# Altium schematic symbol library jlcpcb_2025_04_inductors_extended_0805.schlib: 882 symbols (part 4 of 5)
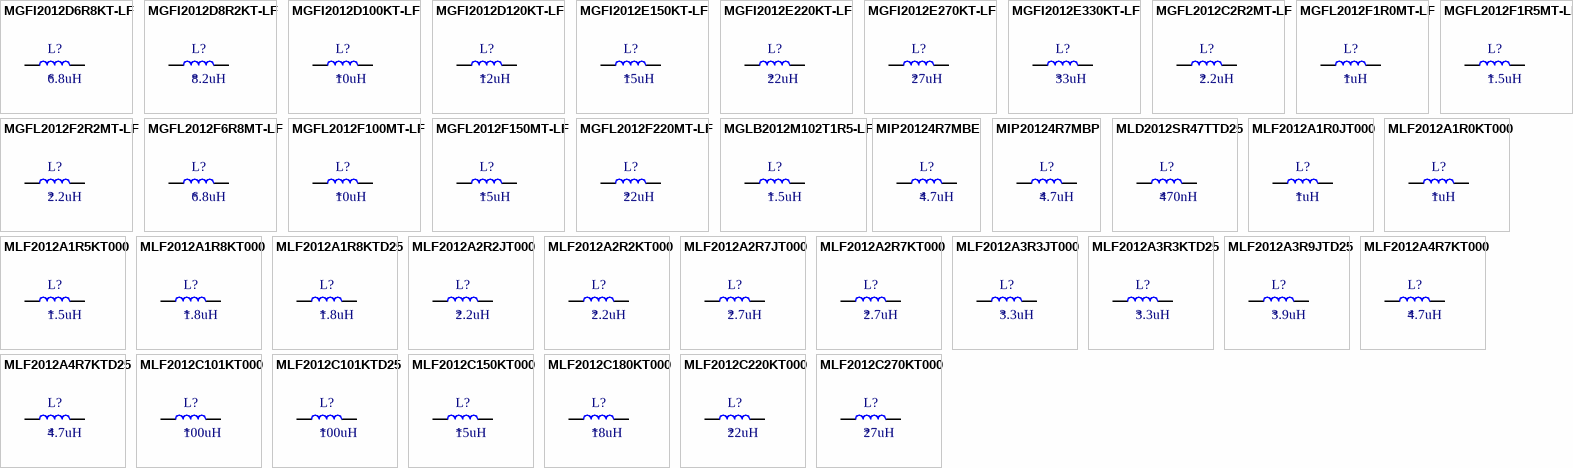
[diagram p25: symbols MGFI2012D6R8KT-LF to MLF2012C270KT000]

## MGLB2012M102T1R5-LF
designator L?  Inductance: 1.5uH
Inductor, 1.5uH, SMD 0805; Manufacturer: microgate; Manufacturer Part Number: MGLB2012M102T1R5-LF; Package Size: 0805; JLCPCB Basic Part: No; JLCPCB Part Number: C5120113; Supplier 1: LCSC; Category: Inductors; Supplier Part Number 1: C5120113; RoHS: Yes; ComponentLink1Description: Datasheet; ComponentLink1URL: https://wmsc.lcsc.com/wmsc/upload/file/pdf/v2/lcsc/2207261100_microgate-MGLB2012M102T1R5-LF_C5120113.pdf; ComponentLink2Description: JLCPCB Part URL; ComponentLink2URL: https://jlcpcb.com/partdetail/C5120113; ComponentLink3Description: LCSC Part URL; ComponentLink3URL: https://lcsc.com/product-detail/Inductors-SMD_microgate-microgate-MGLB2012M102T1R5-LF_C5120113.html
footprint IND-0805 (0805 (2012M) Inductor)
pins: 1, 2

## MIP20124R7MBE
designator L?  Inductance: 4.7uH
Inductor, 4.7uH, ±20%, 230mΩ, 700mA, SMD 0805; Manufacturer: INPAQ; Manufacturer Part Number: MIP20124R7MBE; Package Size: 0805; JLCPCB Basic Part: No; JLCPCB Part Number: C315723; Supplier 1: LCSC; Category: Inductors; Supplier Part Number 1: C315723; Tolerance: ±20%; Rated Current: 700mA; DC Resistance: 230mΩ; RoHS: Yes; ComponentLink1Description: Datasheet; ComponentLink1URL: https://wmsc.lcsc.com/wmsc/upload/file/pdf/v2/lcsc/2304140030_INPAQ-MIP20124R7MBE_C315723.pdf; ComponentLink2Description: JLCPCB Part URL; ComponentLink2URL: https://jlcpcb.com/partdetail/C315723; ComponentLink3Description: LCSC Part URL; ComponentLink3URL: https://lcsc.com/product-detail/Inductors-SMD_INPAQ-INPAQ-MIP20124R7MBE_C315723.html
footprint IND-0805 (0805 (2012M) Inductor)
pins: 1, 2

## MIP20124R7MBP
designator L?  Inductance: 4.7uH
Inductor, 4.7uH, ±20%, SMD 0805; Manufacturer: INPAQ; Manufacturer Part Number: MIP20124R7MBP; Package Size: 0805; JLCPCB Basic Part: No; JLCPCB Part Number: C379996; Supplier 1: LCSC; Category: Inductors; Supplier Part Number 1: C379996; Tolerance: ±20%; RoHS: Yes; ComponentLink1Description: Datasheet; ComponentLink1URL: https://wmsc.lcsc.com/wmsc/upload/file/pdf/v2/lcsc/1912111437_INPAQ-MIP20124R7MBP_C379996.pdf; ComponentLink2Description: JLCPCB Part URL; ComponentLink2URL: https://jlcpcb.com/partdetail/C379996; ComponentLink3Description: LCSC Part URL; ComponentLink3URL: https://lcsc.com/product-detail/Inductors-SMD_INPAQ-INPAQ-MIP20124R7MBP_C379996.html
footprint IND-0805 (0805 (2012M) Inductor)
pins: 1, 2

## MLD2012SR47TTD25
designator L?  Inductance: 470nH
Inductor, 470nH, ±20%, 120mΩ, 1.2A, SMD 0805; Manufacturer: TDK; Manufacturer Part Number: MLD2012SR47TTD25; Package Size: 0805; JLCPCB Basic Part: No; JLCPCB Part Number: C404403; Supplier 1: LCSC; Category: Inductors; Supplier Part Number 1: C404403; Tolerance: ±20%; Rated Current: 1.2A; DC Resistance: 120mΩ; RoHS: Yes; ComponentLink1Description: Datasheet; ComponentLink1URL: https://wmsc.lcsc.com/wmsc/upload/file/pdf/v2/lcsc/2304140030_TDK-MLD2012SR47TTD25_C404403.pdf; ComponentLink2Description: JLCPCB Part URL; ComponentLink2URL: https://jlcpcb.com/partdetail/C404403; ComponentLink3Description: LCSC Part URL; ComponentLink3URL: https://lcsc.com/product-detail/Inductors-SMD_TDK-TDK-MLD2012SR47TTD25_C404403.html
footprint IND-0805 (0805 (2012M) Inductor)
pins: 1, 2

## MLF2012A1R0JT000
designator L?  Inductance: 1uH
Inductor, 1uH, ±5%, 150mΩ, 80mA, SMD 0805; Manufacturer: TDK; Manufacturer Part Number: MLF2012A1R0JT000; Self-Resonant Frequency: 120MHz; Q Factor: 45@10MHz; Package Size: 0805; JLCPCB Basic Part: No; JLCPCB Part Number: C165812; Supplier 1: LCSC; Category: Inductors; Supplier Part Number 1: C165812; Tolerance: ±5%; Rated Current: 80mA; DC Resistance: 150mΩ; RoHS: Yes; ComponentLink1Description: Datasheet; ComponentLink1URL: https://wmsc.lcsc.com/wmsc/upload/file/pdf/v2/lcsc/1810292121_TDK-MLF2012A1R0JT000_C165812.pdf; ComponentLink2Description: JLCPCB Part URL; ComponentLink2URL: https://jlcpcb.com/partdetail/C165812; ComponentLink3Description: LCSC Part URL; ComponentLink3URL: https://lcsc.com/product-detail/Inductors-SMD_TDK-TDK-MLF2012A1R0JT000_C165812.html
footprint IND-0805 (0805 (2012M) Inductor)
pins: 1, 2

## MLF2012A1R0KT000
designator L?  Inductance: 1uH
Inductor, 1uH, ±10%, 150mΩ, 80mA, SMD 0805; Manufacturer: TDK; Manufacturer Part Number: MLF2012A1R0KT000; Self-Resonant Frequency: 120MHz; Q Factor: 45@10MHz; Package Size: 0805; JLCPCB Basic Part: No; JLCPCB Part Number: C19533; Supplier 1: LCSC; Category: Inductors; Supplier Part Number 1: C19533; Tolerance: ±10%; Rated Current: 80mA; DC Resistance: 150mΩ; RoHS: Yes; ComponentLink1Description: Datasheet; ComponentLink1URL: https://wmsc.lcsc.com/wmsc/upload/file/pdf/v2/lcsc/2304140030_TDK-MLF2012A1R0KT000_C19533.pdf; ComponentLink2Description: JLCPCB Part URL; ComponentLink2URL: https://jlcpcb.com/partdetail/C19533; ComponentLink3Description: LCSC Part URL; ComponentLink3URL: https://lcsc.com/product-detail/Inductors-SMD_TDK-TDK-MLF2012A1R0KT000_C19533.html
footprint IND-0805 (0805 (2012M) Inductor)
pins: 1, 2

## MLF2012A1R5KT000
designator L?  Inductance: 1.5uH
Inductor, 1.5uH, ±10%, 180mΩ, 80mA, SMD 0805; Manufacturer: TDK; Manufacturer Part Number: MLF2012A1R5KT000; Self-Resonant Frequency: 140MHz; Q Factor: 60@10MHz; Package Size: 0805; JLCPCB Basic Part: No; JLCPCB Part Number: C275368; Supplier 1: LCSC; Category: Inductors; Supplier Part Number 1: C275368; Tolerance: ±10%; Rated Current: 80mA; DC Resistance: 180mΩ; RoHS: Yes; ComponentLink1Description: Datasheet; ComponentLink1URL: https://wmsc.lcsc.com/wmsc/upload/file/pdf/v2/lcsc/2304140030_TDK-MLF2012A1R5KT000_C275368.pdf; ComponentLink2Description: JLCPCB Part URL; ComponentLink2URL: https://jlcpcb.com/partdetail/C275368; ComponentLink3Description: LCSC Part URL; ComponentLink3URL: https://lcsc.com/product-detail/Inductors-SMD_TDK-TDK-MLF2012A1R5KT000_C275368.html
footprint IND-0805 (0805 (2012M) Inductor)
pins: 1, 2

## MLF2012A1R8KT000
designator L?  Inductance: 1.8uH
Inductor, 1.8uH, ±10%, 200mΩ, 80mA, SMD 0805; Manufacturer: TDK; Manufacturer Part Number: MLF2012A1R8KT000; Self-Resonant Frequency: 90MHz; Q Factor: 45@10MHz; Package Size: 0805; JLCPCB Basic Part: No; JLCPCB Part Number: C15022; Supplier 1: LCSC; Category: Inductors; Supplier Part Number 1: C15022; Tolerance: ±10%; Rated Current: 80mA; DC Resistance: 200mΩ; RoHS: Yes; ComponentLink1Description: Datasheet; ComponentLink1URL: https://wmsc.lcsc.com/wmsc/upload/file/pdf/v2/lcsc/2304140030_TDK-MLF2012A1R8KT000_C15022.pdf; ComponentLink2Description: JLCPCB Part URL; ComponentLink2URL: https://jlcpcb.com/partdetail/C15022; ComponentLink3Description: LCSC Part URL; ComponentLink3URL: https://lcsc.com/product-detail/Inductors-SMD_TDK-TDK-MLF2012A1R8KT000_C15022.html
footprint IND-0805 (0805 (2012M) Inductor)
pins: 1, 2

## MLF2012A1R8KTD25
designator L?  Inductance: 1.8uH
Inductor, 1.8uH, ±10%, 200mΩ, 80mA, SMD 0805; Manufacturer: TDK; Manufacturer Part Number: MLF2012A1R8KTD25; Self-Resonant Frequency: 130MHz; Q Factor: 60@10MHz; Package Size: 0805; JLCPCB Basic Part: No; JLCPCB Part Number: C404466; Supplier 1: LCSC; Category: Inductors; Supplier Part Number 1: C404466; Tolerance: ±10%; Rated Current: 80mA; DC Resistance: 200mΩ; RoHS: Yes; ComponentLink1Description: Datasheet; ComponentLink1URL: https://wmsc.lcsc.com/wmsc/upload/file/pdf/v2/lcsc/2304140030_TDK-MLF2012A1R8KTD25_C404466.pdf; ComponentLink2Description: JLCPCB Part URL; ComponentLink2URL: https://jlcpcb.com/partdetail/C404466; ComponentLink3Description: LCSC Part URL; ComponentLink3URL: https://lcsc.com/product-detail/Inductors-SMD_TDK-TDK-MLF2012A1R8KTD25_C404466.html
footprint IND-0805 (0805 (2012M) Inductor)
pins: 1, 2

## MLF2012A2R2JT000
designator L?  Inductance: 2.2uH
Inductor, 2.2uH, ±5%, 220mΩ, 50mA, SMD 0805; Manufacturer: TDK; Manufacturer Part Number: MLF2012A2R2JT000; Self-Resonant Frequency: 80MHz; Q Factor: 45@10MHz; Package Size: 0805; JLCPCB Basic Part: No; JLCPCB Part Number: C136255; Supplier 1: LCSC; Category: Inductors; Supplier Part Number 1: C136255; Tolerance: ±5%; Rated Current: 50mA; DC Resistance: 220mΩ; RoHS: Yes; ComponentLink1Description: Datasheet; ComponentLink1URL: https://wmsc.lcsc.com/wmsc/upload/file/pdf/v2/lcsc/2304140030_TDK-MLF2012A2R2JT000_C136255.pdf; ComponentLink2Description: JLCPCB Part URL; ComponentLink2URL: https://jlcpcb.com/partdetail/C136255; ComponentLink3Description: LCSC Part URL; ComponentLink3URL: https://lcsc.com/product-detail/Inductors-SMD_TDK-TDK-MLF2012A2R2JT000_C136255.html
footprint IND-0805 (0805 (2012M) Inductor)
pins: 1, 2

## MLF2012A2R2KT000
designator L?  Inductance: 2.2uH
Inductor, 2.2uH, ±10%, 220mΩ, 50mA, SMD 0805; Manufacturer: TDK; Manufacturer Part Number: MLF2012A2R2KT000; Self-Resonant Frequency: 120MHz; Q Factor: 60@10MHz; Package Size: 0805; JLCPCB Basic Part: No; JLCPCB Part Number: C136256; Supplier 1: LCSC; Category: Inductors; Supplier Part Number 1: C136256; Tolerance: ±10%; Rated Current: 50mA; DC Resistance: 220mΩ; RoHS: Yes; ComponentLink1Description: Datasheet; ComponentLink1URL: https://wmsc.lcsc.com/wmsc/upload/file/pdf/v2/lcsc/2304140030_TDK-MLF2012A2R2KT000_C136256.pdf; ComponentLink2Description: JLCPCB Part URL; ComponentLink2URL: https://jlcpcb.com/partdetail/C136256; ComponentLink3Description: LCSC Part URL; ComponentLink3URL: https://lcsc.com/product-detail/Inductors-SMD_TDK-TDK-MLF2012A2R2KT000_C136256.html
footprint IND-0805 (0805 (2012M) Inductor)
pins: 1, 2

## MLF2012A2R7JT000
designator L?  Inductance: 2.7uH
Inductor, 2.7uH, ±5%, 250mΩ, 50mA, SMD 0805; Manufacturer: TDK; Manufacturer Part Number: MLF2012A2R7JT000; Self-Resonant Frequency: 80MHz; Q Factor: 45@10MHz; Package Size: 0805; JLCPCB Basic Part: No; JLCPCB Part Number: C275369; Supplier 1: LCSC; Category: Inductors; Supplier Part Number 1: C275369; Tolerance: ±5%; Rated Current: 50mA; DC Resistance: 250mΩ; RoHS: Yes; ComponentLink1Description: Datasheet; ComponentLink1URL: https://wmsc.lcsc.com/wmsc/upload/file/pdf/v2/lcsc/2304140030_TDK-MLF2012A2R7JT000_C275369.pdf; ComponentLink2Description: JLCPCB Part URL; ComponentLink2URL: https://jlcpcb.com/partdetail/C275369; ComponentLink3Description: LCSC Part URL; ComponentLink3URL: https://lcsc.com/product-detail/Inductors-SMD_TDK-TDK-MLF2012A2R7JT000_C275369.html
footprint IND-0805 (0805 (2012M) Inductor)
pins: 1, 2

## MLF2012A2R7KT000
designator L?  Inductance: 2.7uH
Inductor, 2.7uH, ±10%, 250mΩ, 50mA, SMD 0805; Manufacturer: TDK; Manufacturer Part Number: MLF2012A2R7KT000; Self-Resonant Frequency: 70MHz; Q Factor: 45@10MHz; Package Size: 0805; JLCPCB Basic Part: No; JLCPCB Part Number: C275370; Supplier 1: LCSC; Category: Inductors; Supplier Part Number 1: C275370; Tolerance: ±10%; Rated Current: 50mA; DC Resistance: 250mΩ; RoHS: Yes; ComponentLink1Description: Datasheet; ComponentLink1URL: https://wmsc.lcsc.com/wmsc/upload/file/pdf/v2/lcsc/2304140030_TDK-MLF2012A2R7KT000_C275370.pdf; ComponentLink2Description: JLCPCB Part URL; ComponentLink2URL: https://jlcpcb.com/partdetail/C275370; ComponentLink3Description: LCSC Part URL; ComponentLink3URL: https://lcsc.com/product-detail/Inductors-SMD_TDK-TDK-MLF2012A2R7KT000_C275370.html
footprint IND-0805 (0805 (2012M) Inductor)
pins: 1, 2

## MLF2012A3R3JT000
designator L?  Inductance: 3.3uH
Inductor, 3.3uH, ±5%, 280mΩ, 50mA, SMD 0805; Manufacturer: TDK; Manufacturer Part Number: MLF2012A3R3JT000; Self-Resonant Frequency: 60MHz; Q Factor: 45@10MHz; Package Size: 0805; JLCPCB Basic Part: No; JLCPCB Part Number: C275371; Supplier 1: LCSC; Category: Inductors; Supplier Part Number 1: C275371; Tolerance: ±5%; Rated Current: 50mA; DC Resistance: 280mΩ; RoHS: Yes; ComponentLink1Description: Datasheet; ComponentLink1URL: https://wmsc.lcsc.com/wmsc/upload/file/pdf/v2/lcsc/2304140030_TDK-MLF2012A3R3JT000_C275371.pdf; ComponentLink2Description: JLCPCB Part URL; ComponentLink2URL: https://jlcpcb.com/partdetail/C275371; ComponentLink3Description: LCSC Part URL; ComponentLink3URL: https://lcsc.com/product-detail/Inductors-SMD_TDK-TDK-MLF2012A3R3JT000_C275371.html
footprint IND-0805 (0805 (2012M) Inductor)
pins: 1, 2

## MLF2012A3R3KTD25
designator L?  Inductance: 3.3uH
Inductor, 3.3uH, ±10%, 280mΩ, 50mA, SMD 0805; Manufacturer: TDK; Manufacturer Part Number: MLF2012A3R3KTD25; Self-Resonant Frequency: 90MHz; Q Factor: 70@10MHz; Package Size: 0805; JLCPCB Basic Part: No; JLCPCB Part Number: C404469; Supplier 1: LCSC; Category: Inductors; Supplier Part Number 1: C404469; Tolerance: ±10%; Rated Current: 50mA; DC Resistance: 280mΩ; RoHS: Yes; ComponentLink1Description: Datasheet; ComponentLink1URL: https://wmsc.lcsc.com/wmsc/upload/file/pdf/v2/lcsc/2304140030_TDK-MLF2012A3R3KTD25_C404469.pdf; ComponentLink2Description: JLCPCB Part URL; ComponentLink2URL: https://jlcpcb.com/partdetail/C404469; ComponentLink3Description: LCSC Part URL; ComponentLink3URL: https://lcsc.com/product-detail/Inductors-SMD_TDK-TDK-MLF2012A3R3KTD25_C404469.html
footprint IND-0805 (0805 (2012M) Inductor)
pins: 1, 2

## MLF2012A3R9JTD25
designator L?  Inductance: 3.9uH
Inductor, 3.9uH, ±5%, 300mΩ, 30mA, SMD 0805; Manufacturer: TDK; Manufacturer Part Number: MLF2012A3R9JTD25; Self-Resonant Frequency: 80MHz; Q Factor: 70@10MHz; Package Size: 0805; JLCPCB Basic Part: No; JLCPCB Part Number: C404443; Supplier 1: LCSC; Category: Inductors; Supplier Part Number 1: C404443; Tolerance: ±5%; Rated Current: 30mA; DC Resistance: 300mΩ; RoHS: Yes; ComponentLink1Description: Datasheet; ComponentLink1URL: https://wmsc.lcsc.com/wmsc/upload/file/pdf/v2/lcsc/2304140030_TDK-MLF2012A3R9JTD25_C404443.pdf; ComponentLink2Description: JLCPCB Part URL; ComponentLink2URL: https://jlcpcb.com/partdetail/C404443; ComponentLink3Description: LCSC Part URL; ComponentLink3URL: https://lcsc.com/product-detail/Inductors-SMD_TDK-TDK-MLF2012A3R9JTD25_C404443.html
footprint IND-0805 (0805 (2012M) Inductor)
pins: 1, 2

## MLF2012A4R7KT000
designator L?  Inductance: 4.7uH
Inductor, 4.7uH, ±10%, 350mΩ, 30mA, SMD 0805; Manufacturer: TDK; Manufacturer Part Number: MLF2012A4R7KT000; Self-Resonant Frequency: 70MHz; Q Factor: 70@10MHz; Package Size: 0805; JLCPCB Basic Part: No; JLCPCB Part Number: C76736; Supplier 1: LCSC; Category: Inductors; Supplier Part Number 1: C76736; Tolerance: ±10%; Rated Current: 30mA; DC Resistance: 350mΩ; RoHS: Yes; ComponentLink1Description: Datasheet; ComponentLink1URL: https://wmsc.lcsc.com/wmsc/upload/file/pdf/v2/lcsc/2304140030_TDK-MLF2012A4R7KT000_C76736.pdf; ComponentLink2Description: JLCPCB Part URL; ComponentLink2URL: https://jlcpcb.com/partdetail/C76736; ComponentLink3Description: LCSC Part URL; ComponentLink3URL: https://lcsc.com/product-detail/Inductors-SMD_TDK-TDK-MLF2012A4R7KT000_C76736.html
footprint IND-0805 (0805 (2012M) Inductor)
pins: 1, 2

## MLF2012A4R7KTD25
designator L?  Inductance: 4.7uH
Inductor, 4.7uH, ±10%, 350mΩ, 30mA, SMD 0805; Manufacturer: TDK; Manufacturer Part Number: MLF2012A4R7KTD25; Self-Resonant Frequency: 70MHz; Q Factor: 70@10MHz; Package Size: 0805; JLCPCB Basic Part: No; JLCPCB Part Number: C404471; Supplier 1: LCSC; Category: Inductors; Supplier Part Number 1: C404471; Tolerance: ±10%; Rated Current: 30mA; DC Resistance: 350mΩ; RoHS: Yes; ComponentLink1Description: Datasheet; ComponentLink1URL: https://wmsc.lcsc.com/wmsc/upload/file/pdf/v2/lcsc/2304140030_TDK-MLF2012A4R7KTD25_C404471.pdf; ComponentLink2Description: JLCPCB Part URL; ComponentLink2URL: https://jlcpcb.com/partdetail/C404471; ComponentLink3Description: LCSC Part URL; ComponentLink3URL: https://lcsc.com/product-detail/Inductors-SMD_TDK-TDK-MLF2012A4R7KTD25_C404471.html
footprint IND-0805 (0805 (2012M) Inductor)
pins: 1, 2

## MLF2012C101KT000
designator L?  Inductance: 100uH
Inductor, 100uH, ±10%, 2.5Ω, 2mA, SMD 0805; Manufacturer: TDK; Manufacturer Part Number: MLF2012C101KT000; Self-Resonant Frequency: 7MHz; Q Factor: 25@1MHz; Package Size: 0805; JLCPCB Basic Part: No; JLCPCB Part Number: C68035; Supplier 1: LCSC; Category: Inductors; Supplier Part Number 1: C68035; Tolerance: ±10%; Rated Current: 2mA; DC Resistance: 2.5Ω; RoHS: Yes; ComponentLink1Description: Datasheet; ComponentLink1URL: https://wmsc.lcsc.com/wmsc/upload/file/pdf/v2/lcsc/1810162253_TDK-MLF2012C101KT000_C68035.pdf; ComponentLink2Description: JLCPCB Part URL; ComponentLink2URL: https://jlcpcb.com/partdetail/C68035; ComponentLink3Description: LCSC Part URL; ComponentLink3URL: https://lcsc.com/product-detail/Inductors-SMD_TDK-TDK-MLF2012C101KT000_C68035.html
footprint IND-0805 (0805 (2012M) Inductor)
pins: 1, 2

## MLF2012C101KTD25
designator L?  Inductance: 100uH
Inductor, 100uH, ±10%, 2.5Ω, 2mA, SMD 0805; Manufacturer: TDK; Manufacturer Part Number: MLF2012C101KTD25; Self-Resonant Frequency: 7MHz; Q Factor: 25@1MHz; Package Size: 0805; JLCPCB Basic Part: No; JLCPCB Part Number: C404483; Supplier 1: LCSC; Category: Inductors; Supplier Part Number 1: C404483; Tolerance: ±10%; Rated Current: 2mA; DC Resistance: 2.5Ω; RoHS: Yes; ComponentLink1Description: Datasheet; ComponentLink1URL: https://wmsc.lcsc.com/wmsc/upload/file/pdf/v2/lcsc/2304140030_TDK-MLF2012C101KTD25_C404483.pdf; ComponentLink2Description: JLCPCB Part URL; ComponentLink2URL: https://jlcpcb.com/partdetail/C404483; ComponentLink3Description: LCSC Part URL; ComponentLink3URL: https://lcsc.com/product-detail/Inductors-SMD_TDK-TDK-MLF2012C101KTD25_C404483.html
footprint IND-0805 (0805 (2012M) Inductor)
pins: 1, 2

## MLF2012C150KT000
designator L?  Inductance: 15uH
Inductor, 15uH, ±10%, 350mΩ, 5mA, SMD 0805; Manufacturer: TDK; Manufacturer Part Number: MLF2012C150KT000; Self-Resonant Frequency: 22MHz; Q Factor: 30@1MHz; Package Size: 0805; JLCPCB Basic Part: No; JLCPCB Part Number: C275373; Supplier 1: LCSC; Category: Inductors; Supplier Part Number 1: C275373; Tolerance: ±10%; Rated Current: 5mA; DC Resistance: 350mΩ; RoHS: Yes; ComponentLink1Description: Datasheet; ComponentLink1URL: https://wmsc.lcsc.com/wmsc/upload/file/pdf/v2/lcsc/2304140030_TDK-MLF2012C150KT000_C275373.pdf; ComponentLink2Description: JLCPCB Part URL; ComponentLink2URL: https://jlcpcb.com/partdetail/C275373; ComponentLink3Description: LCSC Part URL; ComponentLink3URL: https://lcsc.com/product-detail/Inductors-SMD_TDK-TDK-MLF2012C150KT000_C275373.html
footprint IND-0805 (0805 (2012M) Inductor)
pins: 1, 2

## MLF2012C180KT000
designator L?  Inductance: 18uH
Inductor, 18uH, ±10%, 380mΩ, 5mA, SMD 0805; Manufacturer: TDK; Manufacturer Part Number: MLF2012C180KT000; Self-Resonant Frequency: 38MHz; Q Factor: 45@1MHz; Package Size: 0805; JLCPCB Basic Part: No; JLCPCB Part Number: C275374; Supplier 1: LCSC; Category: Inductors; Supplier Part Number 1: C275374; Tolerance: ±10%; Rated Current: 5mA; DC Resistance: 380mΩ; RoHS: Yes; ComponentLink1Description: Datasheet; ComponentLink1URL: https://wmsc.lcsc.com/wmsc/upload/file/pdf/v2/lcsc/2304140030_TDK-MLF2012C180KT000_C275374.pdf; ComponentLink2Description: JLCPCB Part URL; ComponentLink2URL: https://jlcpcb.com/partdetail/C275374; ComponentLink3Description: LCSC Part URL; ComponentLink3URL: https://lcsc.com/product-detail/Inductors-SMD_TDK-TDK-MLF2012C180KT000_C275374.html
footprint IND-0805 (0805 (2012M) Inductor)
pins: 1, 2

## MLF2012C220KT000
designator L?  Inductance: 22uH
Inductor, 22uH, ±10%, 450mΩ, 5mA, SMD 0805; Manufacturer: TDK; Manufacturer Part Number: MLF2012C220KT000; Self-Resonant Frequency: 35MHz; Q Factor: 45@1MHz; Package Size: 0805; JLCPCB Basic Part: No; JLCPCB Part Number: C18100; Supplier 1: LCSC; Category: Inductors; Supplier Part Number 1: C18100; Tolerance: ±10%; Rated Current: 5mA; DC Resistance: 450mΩ; RoHS: Yes; ComponentLink1Description: Datasheet; ComponentLink1URL: https://wmsc.lcsc.com/wmsc/upload/file/pdf/v2/lcsc/1811122015_TDK-MLF2012C220KT000_C18100.pdf; ComponentLink2Description: JLCPCB Part URL; ComponentLink2URL: https://jlcpcb.com/partdetail/C18100; ComponentLink3Description: LCSC Part URL; ComponentLink3URL: https://lcsc.com/product-detail/Inductors-SMD_TDK-TDK-MLF2012C220KT000_C18100.html
footprint IND-0805 (0805 (2012M) Inductor)
pins: 1, 2

## MLF2012C270KT000
designator L?  Inductance: 27uH
Inductor, 27uH, ±10%, 500mΩ, 5mA, SMD 0805; Manufacturer: TDK; Manufacturer Part Number: MLF2012C270KT000; Self-Resonant Frequency: 17MHz; Q Factor: 30@1MHz; Package Size: 0805; JLCPCB Basic Part: No; JLCPCB Part Number: C2041700; Supplier 1: LCSC; Category: Inductors; Supplier Part Number 1: C2041700; Tolerance: ±10%; Rated Current: 5mA; DC Resistance: 500mΩ; RoHS: Yes; ComponentLink1Description: Datasheet; ComponentLink1URL: https://wmsc.lcsc.com/wmsc/upload/file/pdf/v2/lcsc/2304140030_TDK-MLF2012C270KT000_C2041700.pdf; ComponentLink2Description: JLCPCB Part URL; ComponentLink2URL: https://jlcpcb.com/partdetail/C2041700; ComponentLink3Description: LCSC Part URL; ComponentLink3URL: https://lcsc.com/product-detail/Inductors-SMD_TDK-TDK-MLF2012C270KT000_C2041700.html
footprint IND-0805 (0805 (2012M) Inductor)
pins: 1, 2

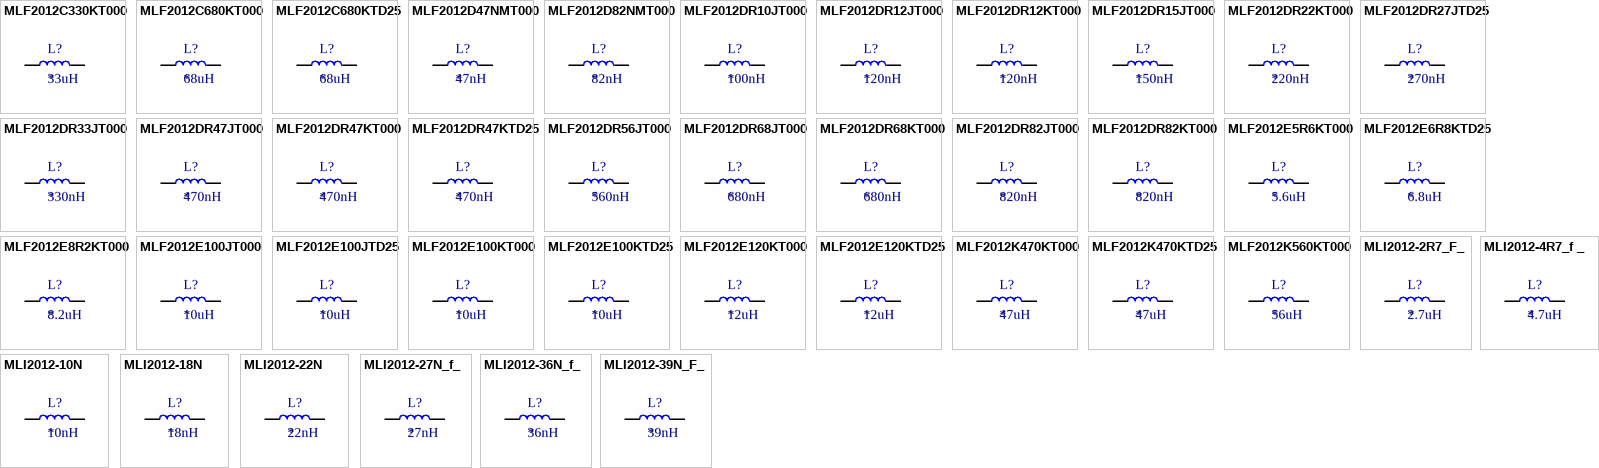
[diagram p15: symbols MLF2012C330KT000 to MLI2012-39N_F_]

## MLF2012C330KT000
designator L?  Inductance: 33uH
Inductor, 33uH, ±10%, 550mΩ, 5mA, SMD 0805; Manufacturer: TDK; Manufacturer Part Number: MLF2012C330KT000; Self-Resonant Frequency: 15MHz; Q Factor: 45@0.4MHz; Package Size: 0805; JLCPCB Basic Part: No; JLCPCB Part Number: C18101; Supplier 1: LCSC; Category: Inductors; Supplier Part Number 1: C18101; Tolerance: ±10%; Rated Current: 5mA; DC Resistance: 550mΩ; RoHS: Yes; ComponentLink1Description: Datasheet; ComponentLink1URL: https://wmsc.lcsc.com/wmsc/upload/file/pdf/v2/lcsc/1810132012_TDK-MLF2012C330KT000_C18101.pdf; ComponentLink2Description: JLCPCB Part URL; ComponentLink2URL: https://jlcpcb.com/partdetail/C18101; ComponentLink3Description: LCSC Part URL; ComponentLink3URL: https://lcsc.com/product-detail/Inductors-SMD_TDK-TDK-MLF2012C330KT000_C18101.html
footprint IND-0805 (0805 (2012M) Inductor)
pins: 1, 2

## MLF2012C680KT000
designator L?  Inductance: 68uH
Inductor, 68uH, ±10%, 2Ω, 2mA, SMD 0805; Manufacturer: TDK; Manufacturer Part Number: MLF2012C680KT000; Self-Resonant Frequency: 9MHz; Q Factor: 25@1MHz; Package Size: 0805; JLCPCB Basic Part: No; JLCPCB Part Number: C275376; Supplier 1: LCSC; Category: Inductors; Supplier Part Number 1: C275376; Tolerance: ±10%; Rated Current: 2mA; DC Resistance: 2Ω; RoHS: Yes; ComponentLink1Description: Datasheet; ComponentLink1URL: https://wmsc.lcsc.com/wmsc/upload/file/pdf/v2/lcsc/2304140030_TDK-MLF2012C680KT000_C275376.pdf; ComponentLink2Description: JLCPCB Part URL; ComponentLink2URL: https://jlcpcb.com/partdetail/C275376; ComponentLink3Description: LCSC Part URL; ComponentLink3URL: https://lcsc.com/product-detail/Inductors-SMD_TDK-TDK-MLF2012C680KT000_C275376.html
footprint IND-0805 (0805 (2012M) Inductor)
pins: 1, 2

## MLF2012C680KTD25
designator L?  Inductance: 68uH
Inductor, 68uH, ±10%, 2Ω, 2mA, SMD 0805; Manufacturer: TDK; Manufacturer Part Number: MLF2012C680KTD25; Self-Resonant Frequency: 16MHz; Q Factor: 45@1MHz; Package Size: 0805; JLCPCB Basic Part: No; JLCPCB Part Number: C404481; Supplier 1: LCSC; Category: Inductors; Supplier Part Number 1: C404481; Tolerance: ±10%; Rated Current: 2mA; DC Resistance: 2Ω; RoHS: Yes; ComponentLink1Description: Datasheet; ComponentLink1URL: https://wmsc.lcsc.com/wmsc/upload/file/pdf/v2/lcsc/2304140030_TDK-MLF2012C680KTD25_C404481.pdf; ComponentLink2Description: JLCPCB Part URL; ComponentLink2URL: https://jlcpcb.com/partdetail/C404481; ComponentLink3Description: LCSC Part URL; ComponentLink3URL: https://lcsc.com/product-detail/Inductors-SMD_TDK-TDK-MLF2012C680KTD25_C404481.html
footprint IND-0805 (0805 (2012M) Inductor)
pins: 1, 2

## MLF2012D47NMT000
designator L?  Inductance: 47nH
Inductor, 47nH, ±20%, 50mΩ, 300mA, SMD 0805; Manufacturer: TDK; Manufacturer Part Number: MLF2012D47NMT000; Self-Resonant Frequency: 700MHz; Q Factor: 25@50MHz; Package Size: 0805; JLCPCB Basic Part: No; JLCPCB Part Number: C275377; Supplier 1: LCSC; Category: Inductors; Supplier Part Number 1: C275377; Tolerance: ±20%; Rated Current: 300mA; DC Resistance: 50mΩ; RoHS: Yes; ComponentLink1Description: Datasheet; ComponentLink1URL: https://wmsc.lcsc.com/wmsc/upload/file/pdf/v2/lcsc/2304140030_TDK-MLF2012D47NMT000_C275377.pdf; ComponentLink2Description: JLCPCB Part URL; ComponentLink2URL: https://jlcpcb.com/partdetail/C275377; ComponentLink3Description: LCSC Part URL; ComponentLink3URL: https://lcsc.com/product-detail/Inductors-SMD_TDK-TDK-MLF2012D47NMT000_C275377.html
footprint IND-0805 (0805 (2012M) Inductor)
pins: 1, 2

## MLF2012D82NMT000
designator L?  Inductance: 82nH
Inductor, 82nH, ±20%, 80mΩ, 300mA, SMD 0805; Manufacturer: TDK; Manufacturer Part Number: MLF2012D82NMT000; Self-Resonant Frequency: 450MHz; Q Factor: 25@50MHz; Package Size: 0805; JLCPCB Basic Part: No; JLCPCB Part Number: C275378; Supplier 1: LCSC; Category: Inductors; Supplier Part Number 1: C275378; Tolerance: ±20%; Rated Current: 300mA; DC Resistance: 80mΩ; RoHS: Yes; ComponentLink1Description: Datasheet; ComponentLink1URL: https://wmsc.lcsc.com/wmsc/upload/file/pdf/v2/lcsc/1912111437_TDK-MLF2012D82NMT000_C275378.pdf; ComponentLink2Description: JLCPCB Part URL; ComponentLink2URL: https://jlcpcb.com/partdetail/C275378; ComponentLink3Description: LCSC Part URL; ComponentLink3URL: https://lcsc.com/product-detail/Inductors-SMD_TDK-TDK-MLF2012D82NMT000_C275378.html
footprint IND-0805 (0805 (2012M) Inductor)
pins: 1, 2

## MLF2012DR10JT000
designator L?  Inductance: 100nH
Inductor, 100nH, ±5%, 100mΩ, 300mA, SMD 0805; Manufacturer: TDK; Manufacturer Part Number: MLF2012DR10JT000; Self-Resonant Frequency: 400MHz; Q Factor: 20@25MHz; Package Size: 0805; JLCPCB Basic Part: No; JLCPCB Part Number: C76737; Supplier 1: LCSC; Category: Inductors; Supplier Part Number 1: C76737; Tolerance: ±5%; Rated Current: 300mA; DC Resistance: 100mΩ; RoHS: Yes; ComponentLink1Description: Datasheet; ComponentLink1URL: https://wmsc.lcsc.com/wmsc/upload/file/pdf/v2/lcsc/2304140030_TDK-MLF2012DR10JT000_C76737.pdf; ComponentLink2Description: JLCPCB Part URL; ComponentLink2URL: https://jlcpcb.com/partdetail/C76737; ComponentLink3Description: LCSC Part URL; ComponentLink3URL: https://lcsc.com/product-detail/Inductors-SMD_TDK-TDK-MLF2012DR10JT000_C76737.html
footprint IND-0805 (0805 (2012M) Inductor)
pins: 1, 2

## MLF2012DR12JT000
designator L?  Inductance: 120nH
Inductor, 120nH, ±5%, 120mΩ, 300mA, SMD 0805; Manufacturer: TDK; Manufacturer Part Number: MLF2012DR12JT000; Self-Resonant Frequency: 360MHz; Q Factor: 20@25MHz; Package Size: 0805; JLCPCB Basic Part: No; JLCPCB Part Number: C275379; Supplier 1: LCSC; Category: Inductors; Supplier Part Number 1: C275379; Tolerance: ±5%; Rated Current: 300mA; DC Resistance: 120mΩ; RoHS: Yes; ComponentLink1Description: Datasheet; ComponentLink1URL: https://wmsc.lcsc.com/wmsc/upload/file/pdf/v2/lcsc/2304140030_TDK-MLF2012DR12JT000_C275379.pdf; ComponentLink2Description: JLCPCB Part URL; ComponentLink2URL: https://jlcpcb.com/partdetail/C275379; ComponentLink3Description: LCSC Part URL; ComponentLink3URL: https://lcsc.com/product-detail/Inductors-SMD_TDK-TDK-MLF2012DR12JT000_C275379.html
footprint IND-0805 (0805 (2012M) Inductor)
pins: 1, 2

## MLF2012DR12KT000
designator L?  Inductance: 120nH
Inductor, 120nH, ±10%, 120mΩ, 300mA, SMD 0805; Manufacturer: TDK; Manufacturer Part Number: MLF2012DR12KT000; Self-Resonant Frequency: 360MHz; Q Factor: 20@25MHz; Package Size: 0805; JLCPCB Basic Part: No; JLCPCB Part Number: C76738; Supplier 1: LCSC; Category: Inductors; Supplier Part Number 1: C76738; Tolerance: ±10%; Rated Current: 300mA; DC Resistance: 120mΩ; RoHS: Yes; ComponentLink1Description: Datasheet; ComponentLink1URL: https://wmsc.lcsc.com/wmsc/upload/file/pdf/v2/lcsc/2304140030_TDK-MLF2012DR12KT000_C76738.pdf; ComponentLink2Description: JLCPCB Part URL; ComponentLink2URL: https://jlcpcb.com/partdetail/C76738; ComponentLink3Description: LCSC Part URL; ComponentLink3URL: https://lcsc.com/product-detail/Inductors-SMD_TDK-TDK-MLF2012DR12KT000_C76738.html
footprint IND-0805 (0805 (2012M) Inductor)
pins: 1, 2

## MLF2012DR15JT000
designator L?  Inductance: 150nH
Inductor, 150nH, ±5%, 130mΩ, 300mA, SMD 0805; Manufacturer: TDK; Manufacturer Part Number: MLF2012DR15JT000; Self-Resonant Frequency: 320MHz; Q Factor: 20@25MHz; Package Size: 0805; JLCPCB Basic Part: No; JLCPCB Part Number: C76739; Supplier 1: LCSC; Category: Inductors; Supplier Part Number 1: C76739; Tolerance: ±5%; Rated Current: 300mA; DC Resistance: 130mΩ; RoHS: Yes; ComponentLink1Description: Datasheet; ComponentLink1URL: https://wmsc.lcsc.com/wmsc/upload/file/pdf/v2/lcsc/2304140030_TDK-MLF2012DR15JT000_C76739.pdf; ComponentLink2Description: JLCPCB Part URL; ComponentLink2URL: https://jlcpcb.com/partdetail/C76739; ComponentLink3Description: LCSC Part URL; ComponentLink3URL: https://lcsc.com/product-detail/Inductors-SMD_TDK-TDK-MLF2012DR15JT000_C76739.html
footprint IND-0805 (0805 (2012M) Inductor)
pins: 1, 2

## MLF2012DR22KT000
designator L?  Inductance: 220nH
Inductor, 220nH, ±10%, 160mΩ, 250mA, SMD 0805; Manufacturer: TDK; Manufacturer Part Number: MLF2012DR22KT000; Self-Resonant Frequency: 250MHz; Q Factor: 20@25MHz; Package Size: 0805; JLCPCB Basic Part: No; JLCPCB Part Number: C2041935; Supplier 1: LCSC; Category: Inductors; Supplier Part Number 1: C2041935; Tolerance: ±10%; Rated Current: 250mA; DC Resistance: 160mΩ; RoHS: Yes; ComponentLink1Description: Datasheet; ComponentLink1URL: https://wmsc.lcsc.com/wmsc/upload/file/pdf/v2/lcsc/2304140030_TDK-MLF2012DR22KT000_C2041935.pdf; ComponentLink2Description: JLCPCB Part URL; ComponentLink2URL: https://jlcpcb.com/partdetail/C2041935; ComponentLink3Description: LCSC Part URL; ComponentLink3URL: https://lcsc.com/product-detail/Inductors-SMD_TDK-TDK-MLF2012DR22KT000_C2041935.html
footprint IND-0805 (0805 (2012M) Inductor)
pins: 1, 2

## MLF2012DR27JTD25
designator L?  Inductance: 270nH
Inductor, 270nH, ±5%, 180mΩ, 250mA, SMD 0805; Manufacturer: TDK; Manufacturer Part Number: MLF2012DR27JTD25; Self-Resonant Frequency: 300MHz; Q Factor: 30@25MHz; Package Size: 0805; JLCPCB Basic Part: No; JLCPCB Part Number: C404430; Supplier 1: LCSC; Category: Inductors; Supplier Part Number 1: C404430; Tolerance: ±5%; Rated Current: 250mA; DC Resistance: 180mΩ; RoHS: Yes; ComponentLink1Description: Datasheet; ComponentLink1URL: https://wmsc.lcsc.com/wmsc/upload/file/pdf/v2/lcsc/1912111437_TDK-MLF2012DR27JTD25_C404430.pdf; ComponentLink2Description: JLCPCB Part URL; ComponentLink2URL: https://jlcpcb.com/partdetail/C404430; ComponentLink3Description: LCSC Part URL; ComponentLink3URL: https://lcsc.com/product-detail/Inductors-SMD_TDK-TDK-MLF2012DR27JTD25_C404430.html
footprint IND-0805 (0805 (2012M) Inductor)
pins: 1, 2

## MLF2012DR33JT000
designator L?  Inductance: 330nH
Inductor, 330nH, ±5%, 230mΩ, 250mA, SMD 0805; Manufacturer: TDK; Manufacturer Part Number: MLF2012DR33JT000; Self-Resonant Frequency: 270MHz; Q Factor: 30@25MHz; Package Size: 0805; JLCPCB Basic Part: No; JLCPCB Part Number: C87521; Supplier 1: LCSC; Category: Inductors; Supplier Part Number 1: C87521; Tolerance: ±5%; Rated Current: 250mA; DC Resistance: 230mΩ; RoHS: Yes; ComponentLink1Description: Datasheet; ComponentLink1URL: https://wmsc.lcsc.com/wmsc/upload/file/pdf/v2/lcsc/2304140030_TDK-MLF2012DR33JT000_C87521.pdf; ComponentLink2Description: JLCPCB Part URL; ComponentLink2URL: https://jlcpcb.com/partdetail/C87521; ComponentLink3Description: LCSC Part URL; ComponentLink3URL: https://lcsc.com/product-detail/Inductors-SMD_TDK-TDK-MLF2012DR33JT000_C87521.html
footprint IND-0805 (0805 (2012M) Inductor)
pins: 1, 2

## MLF2012DR47JT000
designator L?  Inductance: 470nH
Inductor, 470nH, ±5%, 250mΩ, 200mA, SMD 0805; Manufacturer: TDK; Manufacturer Part Number: MLF2012DR47JT000; Self-Resonant Frequency: 230MHz; Q Factor: 35@25MHz; Package Size: 0805; JLCPCB Basic Part: No; JLCPCB Part Number: C92032; Supplier 1: LCSC; Category: Inductors; Supplier Part Number 1: C92032; Tolerance: ±5%; Rated Current: 200mA; DC Resistance: 250mΩ; RoHS: Yes; ComponentLink1Description: Datasheet; ComponentLink1URL: https://wmsc.lcsc.com/wmsc/upload/file/pdf/v2/lcsc/1810132030_TDK-MLF2012DR47JT000_C92032.pdf; ComponentLink2Description: JLCPCB Part URL; ComponentLink2URL: https://jlcpcb.com/partdetail/C92032; ComponentLink3Description: LCSC Part URL; ComponentLink3URL: https://lcsc.com/product-detail/Inductors-SMD_TDK-TDK-MLF2012DR47JT000_C92032.html
footprint IND-0805 (0805 (2012M) Inductor)
pins: 1, 2

## MLF2012DR47KT000
designator L?  Inductance: 470nH
Inductor, 470nH, ±10%, 250mΩ, 200mA, SMD 0805; Manufacturer: TDK; Manufacturer Part Number: MLF2012DR47KT000; Self-Resonant Frequency: 230MHz; Q Factor: 35@25MHz; Package Size: 0805; JLCPCB Basic Part: No; JLCPCB Part Number: C107317; Supplier 1: LCSC; Category: Inductors; Supplier Part Number 1: C107317; Tolerance: ±10%; Rated Current: 200mA; DC Resistance: 250mΩ; RoHS: Yes; ComponentLink1Description: Datasheet; ComponentLink1URL: https://wmsc.lcsc.com/wmsc/upload/file/pdf/v2/lcsc/2304140030_TDK-MLF2012DR47KT000_C107317.pdf; ComponentLink2Description: JLCPCB Part URL; ComponentLink2URL: https://jlcpcb.com/partdetail/C107317; ComponentLink3Description: LCSC Part URL; ComponentLink3URL: https://lcsc.com/product-detail/Inductors-SMD_TDK-TDK-MLF2012DR47KT000_C107317.html
footprint IND-0805 (0805 (2012M) Inductor)
pins: 1, 2

## MLF2012DR47KTD25
designator L?  Inductance: 470nH
Inductor, 470nH, ±10%, 250mΩ, 200mA, SMD 0805; Manufacturer: TDK; Manufacturer Part Number: MLF2012DR47KTD25; Self-Resonant Frequency: 160MHz; Q Factor: 25@25MHz; Package Size: 0805; JLCPCB Basic Part: No; JLCPCB Part Number: C404459; Supplier 1: LCSC; Category: Inductors; Supplier Part Number 1: C404459; Tolerance: ±10%; Rated Current: 200mA; DC Resistance: 250mΩ; RoHS: Yes; ComponentLink1Description: Datasheet; ComponentLink1URL: https://wmsc.lcsc.com/wmsc/upload/file/pdf/v2/lcsc/2304140030_TDK-MLF2012DR47KTD25_C404459.pdf; ComponentLink2Description: JLCPCB Part URL; ComponentLink2URL: https://jlcpcb.com/partdetail/C404459; ComponentLink3Description: LCSC Part URL; ComponentLink3URL: https://lcsc.com/product-detail/Inductors-SMD_TDK-TDK-MLF2012DR47KTD25_C404459.html
footprint IND-0805 (0805 (2012M) Inductor)
pins: 1, 2

## MLF2012DR56JT000
designator L?  Inductance: 560nH
Inductor, 560nH, ±5%, 300mΩ, 150mA, SMD 0805; Manufacturer: TDK; Manufacturer Part Number: MLF2012DR56JT000; Self-Resonant Frequency: 150MHz; Q Factor: 25@25MHz; Package Size: 0805; JLCPCB Basic Part: No; JLCPCB Part Number: C275383; Supplier 1: LCSC; Category: Inductors; Supplier Part Number 1: C275383; Tolerance: ±5%; Rated Current: 150mA; DC Resistance: 300mΩ; RoHS: Yes; ComponentLink1Description: Datasheet; ComponentLink1URL: https://wmsc.lcsc.com/wmsc/upload/file/pdf/v2/lcsc/2304140030_TDK-MLF2012DR56JT000_C275383.pdf; ComponentLink2Description: JLCPCB Part URL; ComponentLink2URL: https://jlcpcb.com/partdetail/C275383; ComponentLink3Description: LCSC Part URL; ComponentLink3URL: https://lcsc.com/product-detail/Inductors-SMD_TDK-TDK-MLF2012DR56JT000_C275383.html
footprint IND-0805 (0805 (2012M) Inductor)
pins: 1, 2

## MLF2012DR68JT000
designator L?  Inductance: 680nH
Inductor, 680nH, ±5%, 350mΩ, 150mA, SMD 0805; Manufacturer: TDK; Manufacturer Part Number: MLF2012DR68JT000; Self-Resonant Frequency: 190MHz; Q Factor: 35@25MHz; Package Size: 0805; JLCPCB Basic Part: No; JLCPCB Part Number: C2044212; Supplier 1: LCSC; Category: Inductors; Supplier Part Number 1: C2044212; Tolerance: ±5%; Rated Current: 150mA; DC Resistance: 350mΩ; RoHS: Yes; ComponentLink1Description: Datasheet; ComponentLink1URL: https://wmsc.lcsc.com/wmsc/upload/file/pdf/v2/lcsc/2304140030_TDK-MLF2012DR68JT000_C2044212.pdf; ComponentLink2Description: JLCPCB Part URL; ComponentLink2URL: https://jlcpcb.com/partdetail/C2044212; ComponentLink3Description: LCSC Part URL; ComponentLink3URL: https://lcsc.com/product-detail/Inductors-SMD_TDK-TDK-MLF2012DR68JT000_C2044212.html
footprint IND-0805 (0805 (2012M) Inductor)
pins: 1, 2

## MLF2012DR68KT000
designator L?  Inductance: 680nH
Inductor, 680nH, ±10%, 350mΩ, 150mA, SMD 0805; Manufacturer: TDK; Manufacturer Part Number: MLF2012DR68KT000; Self-Resonant Frequency: 140MHz; Q Factor: 25@25MHz; Package Size: 0805; JLCPCB Basic Part: No; JLCPCB Part Number: C114786; Supplier 1: LCSC; Category: Inductors; Supplier Part Number 1: C114786; Tolerance: ±10%; Rated Current: 150mA; DC Resistance: 350mΩ; RoHS: Yes; ComponentLink1Description: Datasheet; ComponentLink1URL: https://wmsc.lcsc.com/wmsc/upload/file/pdf/v2/lcsc/2304140030_TDK-MLF2012DR68KT000_C114786.pdf; ComponentLink2Description: JLCPCB Part URL; ComponentLink2URL: https://jlcpcb.com/partdetail/C114786; ComponentLink3Description: LCSC Part URL; ComponentLink3URL: https://lcsc.com/product-detail/Inductors-SMD_TDK-TDK-MLF2012DR68KT000_C114786.html
footprint IND-0805 (0805 (2012M) Inductor)
pins: 1, 2

## MLF2012DR82JT000
designator L?  Inductance: 820nH
Inductor, 820nH, ±5%, 400mΩ, 150mA, SMD 0805; Manufacturer: TDK; Manufacturer Part Number: MLF2012DR82JT000; Self-Resonant Frequency: 130MHz; Q Factor: 25@25MHz; Package Size: 0805; JLCPCB Basic Part: No; JLCPCB Part Number: C76741; Supplier 1: LCSC; Category: Inductors; Supplier Part Number 1: C76741; Tolerance: ±5%; Rated Current: 150mA; DC Resistance: 400mΩ; RoHS: Yes; ComponentLink1Description: Datasheet; ComponentLink1URL: https://wmsc.lcsc.com/wmsc/upload/file/pdf/v2/lcsc/2304140030_TDK-MLF2012DR82JT000_C76741.pdf; ComponentLink2Description: JLCPCB Part URL; ComponentLink2URL: https://jlcpcb.com/partdetail/C76741; ComponentLink3Description: LCSC Part URL; ComponentLink3URL: https://lcsc.com/product-detail/Inductors-SMD_TDK-TDK-MLF2012DR82JT000_C76741.html
footprint IND-0805 (0805 (2012M) Inductor)
pins: 1, 2

## MLF2012DR82KT000
designator L?  Inductance: 820nH
Inductor, 820nH, ±10%, 400mΩ, 150mA, SMD 0805; Manufacturer: TDK; Manufacturer Part Number: MLF2012DR82KT000; Self-Resonant Frequency: 130MHz; Q Factor: 25@25MHz; Package Size: 0805; JLCPCB Basic Part: No; JLCPCB Part Number: C307696; Supplier 1: LCSC; Category: Inductors; Supplier Part Number 1: C307696; Tolerance: ±10%; Rated Current: 150mA; DC Resistance: 400mΩ; RoHS: Yes; ComponentLink1Description: Datasheet; ComponentLink1URL: https://wmsc.lcsc.com/wmsc/upload/file/pdf/v2/lcsc/2304140030_TDK-MLF2012DR82KT000_C307696.pdf; ComponentLink2Description: JLCPCB Part URL; ComponentLink2URL: https://jlcpcb.com/partdetail/C307696; ComponentLink3Description: LCSC Part URL; ComponentLink3URL: https://lcsc.com/product-detail/Inductors-SMD_TDK-TDK-MLF2012DR82KT000_C307696.html
footprint IND-0805 (0805 (2012M) Inductor)
pins: 1, 2

## MLF2012E5R6KT000
designator L?  Inductance: 5.6uH
Inductor, 5.6uH, ±10%, 300mΩ, 15mA, SMD 0805; Manufacturer: TDK; Manufacturer Part Number: MLF2012E5R6KT000; Self-Resonant Frequency: 45MHz; Q Factor: 75@4MHz; Package Size: 0805; JLCPCB Basic Part: No; JLCPCB Part Number: C307698; Supplier 1: LCSC; Category: Inductors; Supplier Part Number 1: C307698; Tolerance: ±10%; Rated Current: 15mA; DC Resistance: 300mΩ; RoHS: Yes; ComponentLink1Description: Datasheet; ComponentLink1URL: https://wmsc.lcsc.com/wmsc/upload/file/pdf/v2/lcsc/2304140030_TDK-MLF2012E5R6KT000_C307698.pdf; ComponentLink2Description: JLCPCB Part URL; ComponentLink2URL: https://jlcpcb.com/partdetail/C307698; ComponentLink3Description: LCSC Part URL; ComponentLink3URL: https://lcsc.com/product-detail/Inductors-SMD_TDK-TDK-MLF2012E5R6KT000_C307698.html
footprint IND-0805 (0805 (2012M) Inductor)
pins: 1, 2

## MLF2012E6R8KTD25
designator L?  Inductance: 6.8uH
Inductor, 6.8uH, ±10%, 320mΩ, 15mA, SMD 0805; Manufacturer: TDK; Manufacturer Part Number: MLF2012E6R8KTD25; Self-Resonant Frequency: 60MHz; Q Factor: 75@4MHz; Package Size: 0805; JLCPCB Basic Part: No; JLCPCB Part Number: C307699; Supplier 1: LCSC; Category: Inductors; Supplier Part Number 1: C307699; Tolerance: ±10%; Rated Current: 15mA; DC Resistance: 320mΩ; RoHS: Yes; ComponentLink1Description: Datasheet; ComponentLink1URL: https://wmsc.lcsc.com/wmsc/upload/file/pdf/v2/lcsc/2304140030_TDK-MLF2012E6R8KTD25_C307699.pdf; ComponentLink2Description: JLCPCB Part URL; ComponentLink2URL: https://jlcpcb.com/partdetail/C307699; ComponentLink3Description: LCSC Part URL; ComponentLink3URL: https://lcsc.com/product-detail/Inductors-SMD_TDK-TDK-MLF2012E6R8KTD25_C307699.html
footprint IND-0805 (0805 (2012M) Inductor)
pins: 1, 2

## MLF2012E8R2KT000
designator L?  Inductance: 8.2uH
Inductor, 8.2uH, ±10%, 350mΩ, 15mA, SMD 0805; Manufacturer: TDK; Manufacturer Part Number: MLF2012E8R2KT000; Self-Resonant Frequency: 35MHz; Q Factor: 75@4MHz; Package Size: 0805; JLCPCB Basic Part: No; JLCPCB Part Number: C275386; Supplier 1: LCSC; Category: Inductors; Supplier Part Number 1: C275386; Tolerance: ±10%; Rated Current: 15mA; DC Resistance: 350mΩ; RoHS: Yes; ComponentLink1Description: Datasheet; ComponentLink1URL: https://wmsc.lcsc.com/wmsc/upload/file/pdf/v2/lcsc/2304140030_TDK-MLF2012E8R2KT000_C275386.pdf; ComponentLink2Description: JLCPCB Part URL; ComponentLink2URL: https://jlcpcb.com/partdetail/C275386; ComponentLink3Description: LCSC Part URL; ComponentLink3URL: https://lcsc.com/product-detail/Inductors-SMD_TDK-TDK-MLF2012E8R2KT000_C275386.html
footprint IND-0805 (0805 (2012M) Inductor)
pins: 1, 2
